# Altium footprint library YQPOWER.PcbLib: 215 footprints (part 6 of 14)
Each footprint in its own frame and in the unit in brackets; x right, y up, seen from the top. Pads: shape width x height; smd on the part's side, far side on the other; paste and mask are expansions set on the pad; w line width, h text height; cw(c..) or ccw(c..) is an arc to the next point about the centre after c.
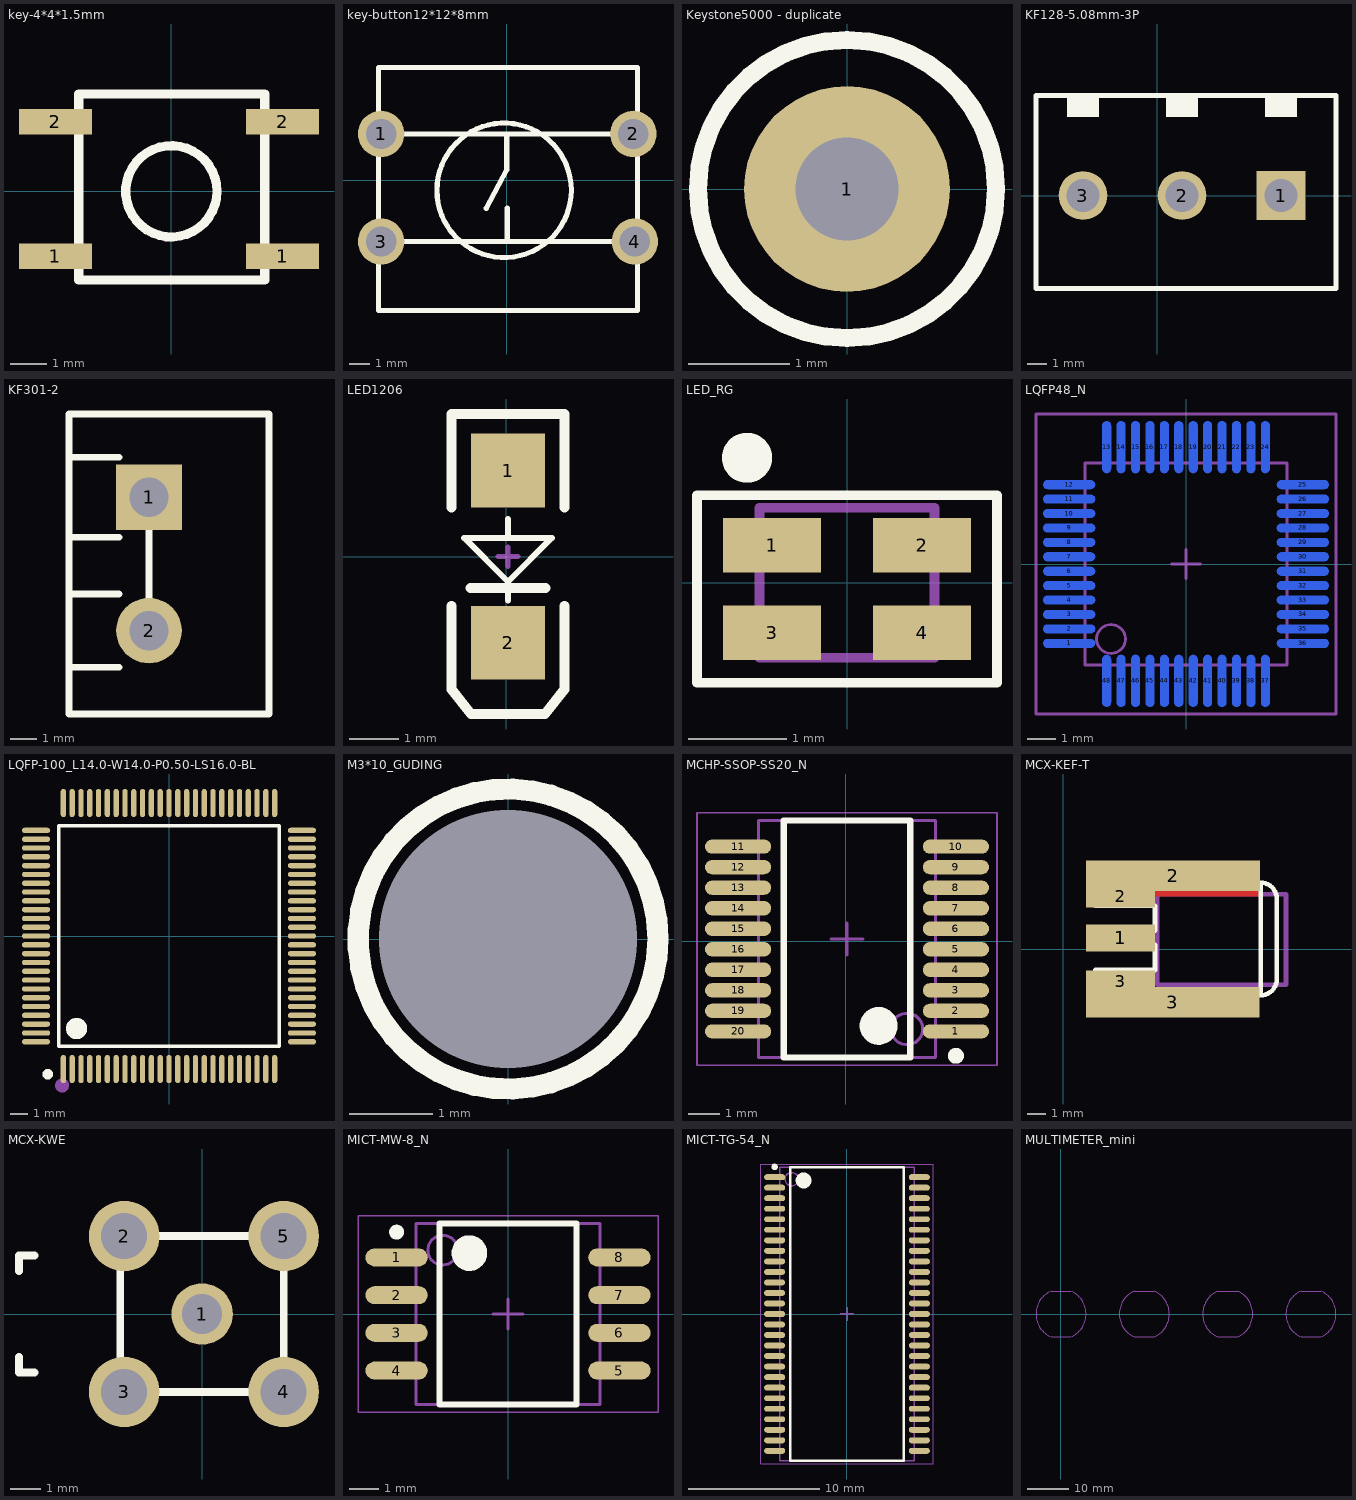
[diagram p5: the footprints below, top view; thin cyan lines are the x and y axes]

## key-4*4*1.5mm [mm]
height 1.5
pads (4):
  rect 2x0.7 smd mask+0.05: 1(-3.175,-1.778) 1(3.048,-1.778) 2(-3.175,1.905) 2(3.048,1.905)
Top Overlay:
  circle w0.254: c0,0 r1.251
  lines w0.254: -2.54,-2.433 2.56,-2.433 2.56,2.667 -2.54,2.667 -2.54,-2.433

## key-button12*12*8mm [mm]
height 10
pads (4):
  round 2.3 hole 1.5: 1(-6.223,2.286) 2(6.277,2.286) 3(-6.223,-3.048) 4(6.35,-3.048)
Top Overlay:
  circle w0.254: c-0.127,-0.508 r3.334
  lines w0.254: -6.223,-3.048 6.277,-3.048 ; -6.223,2.286 6.277,2.286 ; -1.016,-1.397 0,0.508 0,2.159 ; 0.027,-3.048 0.027,-1.397 ; -6.35,-6.477 -6.35,5.588 6.477,5.588 6.477,-6.477 -6.35,-6.477

## Keystone5000 - duplicate [mil] "For Keystone 500x miniature loop terminals"
height 181.1
pads (1):
  round 80 hole 40: 1(0,0)
Top Overlay:
  circle w7: c0,0 r58
Mechanical 5:
  circle w5: c0,0 r58.31
  text ".Designator" at -45,-10 h30
3D body "Keystone_5000.stp": height 181.97, standoff -118.11, extent -49,-49 49.04,49.24

## KF128-5.08mm-3P [mm]
height 8.382
pads (3):
  rect 2.5x2.5 hole 1.7: 1(6.35,0)
  round 2.5 hole 1.7: 2(1.27,0) 3(-3.81,0)
Top Overlay:
  region: -4.64,5.173 -4.64,4.03 -2.989,4.03 -2.989,5.173
  region: 0.44,5.173 0.44,4.03 2.091,4.03 2.091,5.173
  region: 5.52,5.173 5.52,4.03 7.171,4.03 7.171,5.173
  lines w0.254: -6.22,-4.76 -6.22,5.14 9.17,5.14 9.17,-4.76 -6.22,-4.76

## KF301-2 [mm]
pads (2):
  rect 2.5x2.5 hole 1.5: 1(-9.017,10.16)
  round 2.5 hole 1.5: 2(-9.017,5.08)
Top Overlay:
  lines w0.254: -12.065,3.683 -10.16,3.683 ; -12.065,6.477 -10.16,6.477 ; -12.065,8.636 -10.16,8.636 ; -12.065,11.684 -10.16,11.684 ; -9.017,5.16 -9.017,10.16 ; -12.065,1.905 -12.065,13.335 -4.445,13.335 -4.445,1.905 -12.065,1.905

## LED1206 [mm]
pads (2):
  rect 1.5x1.5 smd: 1(0.036,1.75) 2(0.036,-1.75)
Top Overlay:
  lines w0.125: 0.036,-0.889 0.036,-0.508 ; 0.036,0.381 0.036,0.762 ; 0.036,-0.508 0.925,0.381 -0.853,0.381 0.036,-0.508
  lines w0.2: -1.114,-1 -1.114,-2.7 -0.714,-3.2 0.786,-3.2 1.186,-2.7 1.186,-1 ; -1.114,1 -1.114,2.9 1.186,2.9 1.186,1 ; -0.726,-0.635 0.798,-0.635
Mechanical 1:
  lines w0.1: -0.164,0 0.236,0 ; 0.036,-0.2 0.036,0.2

## LED_RG [mm]
pads (4):
  rect 1x0.55 smd: 1(-0.762,0.381) 2(0.762,0.381) 3(-0.762,-0.508) 4(0.762,-0.508)
Top Overlay:
  circle w0.254: c-1.016,1.27 r0.127
  lines w0.1: -1.524,-1.016 -1.524,0.889 1.524,0.889 1.524,-1.016 -1.524,-1.016
Mechanical 3:
  lines w0.1: -0.889,-0.762 -0.889,0.762 0.889,0.762 0.889,-0.762 -0.889,-0.762

## LQFP48_N [mm] "Thin QFP, 48-Leads, Body 7x7mm, Pitch 0.5mm, IPC Medium Density"
height 1.6
pads (48):
  oval 1.8x0.3 smd far side: 1(-4.05,-2.75) 2(-4.05,-2.25) 3(-4.05,-1.75) 4(-4.05,-1.25) 5(-4.05,-0.75) 6(-4.05,-0.25) 7(-4.05,0.25) 8(-4.05,0.75) 9(-4.05,1.25) 10(-4.05,1.75) 11(-4.05,2.25) 12(-4.05,2.75) 25(4.05,2.75) 26(4.05,2.25) 27(4.05,1.75) 28(4.05,1.25) 29(4.05,0.75) 30(4.05,0.25) 31(4.05,-0.25) 32(4.05,-0.75) 33(4.05,-1.25) 34(4.05,-1.75) 35(4.05,-2.25) 36(4.05,-2.75)
  oval 0.3x1.8 smd far side: 13(-2.75,4.05) 14(-2.25,4.05) 15(-1.75,4.05) 16(-1.25,4.05) 17(-0.75,4.05) 18(-0.25,4.05) 19(0.25,4.05) 20(0.75,4.05) 21(1.25,4.05) 22(1.75,4.05) 23(2.25,4.05) 24(2.75,4.05) 37(2.75,-4.05) 38(2.25,-4.05) 39(1.75,-4.05) 40(1.25,-4.05) 41(0.75,-4.05) 42(0.25,-4.05) 43(-0.25,-4.05) 44(-0.75,-4.05) 45(-1.25,-4.05) 46(-1.75,-4.05) 47(-2.25,-4.05) 48(-2.75,-4.05)
Bottom Overlay:
  circle w0.25: c-4.05,-3.45 r0.125
  circle w0.6: c-1.75,-1.75 r0.3
  lines w0.2: -2.75,-2.75 -2.75,2.75 2.75,2.75 2.75,-2.75 -2.75,-2.75
Mechanical 13:
  circle w0.1: c-2.6,-2.6 r0.5
  lines w0.1: -3.5,-3.5 -3.5,3.5 3.5,3.5 3.5,-3.5 -3.5,-3.5
Mechanical 15:
  lines w0.1: -0.5,0 0.5,0 ; 0,-0.5 0,0.5 ; -5.2,-5.2 -5.2,5.2 5.2,5.2 5.2,-5.2 -5.2,-5.2
3D body: height 1.6, standoff 0, extent -3.5,-3.5 3.5,3.5

## LQFP-100_L14.0-W14.0-P0.50-LS16.0-BL [mm]
pads (100):
  oval 0.3x1.6 smd: 1(-6,-7.55) 2(-5.5,-7.55) 3(-5,-7.55) 4(-4.5,-7.55) 5(-4,-7.55) 6(-3.5,-7.55) 7(-3,-7.55) 8(-2.5,-7.55) 9(-2,-7.55) 10(-1.5,-7.55) 11(-1,-7.55) 12(-0.5,-7.55) 13(0,-7.55) 14(0.5,-7.55) 15(1,-7.55) 16(1.5,-7.55) 17(2,-7.55) 18(2.5,-7.55) 19(3,-7.55) 20(3.5,-7.55) 21(4,-7.55) 22(4.5,-7.55) 23(5,-7.55) 24(5.5,-7.55) 25(6,-7.55) 51(6,7.55) 52(5.5,7.55) 53(5,7.55) 54(4.5,7.55) 55(4,7.55) 56(3.5,7.55) 57(3,7.55) 58(2.5,7.55) 59(2,7.55) 60(1.5,7.55) 61(1,7.55) 62(0.5,7.55) 63(0,7.55) 64(-0.5,7.55) 65(-1,7.55) 66(-1.5,7.55) 67(-2,7.55) 68(-2.5,7.55) 69(-3,7.55) 70(-3.5,7.55) 71(-4,7.55) 72(-4.5,7.55) 73(-5,7.55) 74(-5.5,7.55) 75(-6,7.55)
  oval 1.6x0.3 smd: 26(7.55,-6) 27(7.55,-5.5) 28(7.55,-5) 29(7.55,-4.5) 30(7.55,-4) 31(7.55,-3.5) 32(7.55,-3) 33(7.55,-2.5) 34(7.55,-2) 35(7.55,-1.5) 36(7.55,-1) 37(7.55,-0.5) 38(7.55,0) 39(7.55,0.5) 40(7.55,1) 41(7.55,1.5) 42(7.55,2) 43(7.55,2.5) 44(7.55,3) 45(7.55,3.5) 46(7.55,4) 47(7.55,4.5) 48(7.55,5) 49(7.55,5.5) 50(7.55,6) 76(-7.55,6) 77(-7.55,5.5) 78(-7.55,5) 79(-7.55,4.5) 80(-7.55,4) 81(-7.55,3.5) 82(-7.55,3) 83(-7.55,2.5) 84(-7.55,2) 85(-7.55,1.5) 86(-7.55,1) 87(-7.55,0.5) 88(-7.55,0) 89(-7.55,-0.5) 90(-7.55,-1) 91(-7.55,-1.5) 92(-7.55,-2) 93(-7.55,-2.5) 94(-7.55,-3) 95(-7.55,-3.5) 96(-7.55,-4) 97(-7.55,-4.5) 98(-7.55,-5) 99(-7.55,-5.5) 100(-7.55,-6)
Top Overlay:
  lines w0.2: -6.25,-6.25 -6.25,6.25 6.25,6.25 6.25,-6.25 -6.25,-6.25
  lines w0.3: -6.883,-7.696 ccw(c-6.882,-7.846) -6.881,-7.696
  lines w0.6: -5.25,-4.95 ccw(c-5.248,-5.25) -5.245,-4.95
Mechanical 15:
  circle w0.4: c-6.071,-8.484 r0.2

## M3*10_GUDING [mm]
pads (1):
  round 0 hole 3.1: 1(0,0)
Top Overlay:
  circle w0.254: c0,0 r1.8

## MCHP-SSOP-SS20_N [mm]
pads (20):
  oval 2.1x0.45 smd: 1(3.488,-2.861) 2(3.488,-2.211) 3(3.488,-1.561) 4(3.488,-0.911) 5(3.488,-0.261) 6(3.488,0.389) 7(3.488,1.039) 8(3.488,1.689) 9(3.488,2.339) 10(3.488,2.989) 11(-3.412,2.989) 12(-3.412,2.339) 13(-3.412,1.689) 14(-3.412,1.039) 15(-3.412,0.389) 16(-3.412,-0.261) 17(-3.412,-0.911) 18(-3.412,-1.561) 19(-3.412,-2.211) 20(-3.412,-2.861)
Top Overlay:
  circle w0.6: c1.038,-2.686 r0.3
  circle w0.25: c3.488,-3.636 r0.125
  lines w0.2: -1.962,-3.686 2.038,-3.686 2.038,3.814 -1.962,3.814 -1.962,-3.686
Mechanical 13:
  circle w0.1: c1.938,-2.786 r0.5
  lines w0.1: -2.762,-3.686 2.838,-3.686 2.838,3.814 -2.762,3.814 -2.762,-3.686
Mechanical 15:
  lines w0.05: -4.712,-3.936 4.788,-3.936 4.788,4.064 -4.712,4.064 -4.712,-3.936
  lines w0.1: -0.462,0.064 0.538,0.064 ; 0.038,-0.436 0.038,0.564
3D body: height 2, standoff 0.05, extent -2.762,-3.686 2.838,3.814

## MCX-KEF-T [mm] "贴片柱子"
height 5
pads (5):
  rect 3.8x1.5 smd: 1(3.175,0.635)
  rect 3.8x1.2 smd: 2(3.175,2.921) 3(3.175,-1.778)
  rect 9.6x1.7 smd: 2(6.08,4.06) 3(6.07,-2.92)
Top Layer:
  rectangle: 4.064,2.921 10.922,3.683
Top Overlay:
  lines w0.254: 10.287,-2.54 10.922,-2.54 ; 10.414,3.683 10.922,3.683 ; 10.922,-2.54 ccw(c10.922,-1.651) 11.811,-1.651 11.811,2.794 ccw(c10.922,2.794) 10.922,3.683 ; 10.922,-2.54 1.905,-2.54 1.778,-2.54 1.778,-1.143 5.08,-1.143 5.08,0.254 1.778,0.254 1.778,0.381 1.778,1.016 5.08,1.016 5.08,2.413 1.778,2.413 1.778,2.667 1.778,3.683 10.922,3.683 ; 10.922,-2.54 10.922,3.683
Mechanical 1:
  lines w0.254: 5.207,-1.952 5.207,3.048 12.319,3.048 12.319,-1.952 5.207,-1.952

## MCX-KWE [mm] "6MM"
pads (5):
  round 2 hole 1.3: 1(0,0)
  round 2.3 hole 1.5: 2(-2.54,2.54) 3(-2.54,-2.54) 4(2.66,-2.54) 5(2.66,2.54)
Top Overlay:
  lines w0.254: -5.969,-1.397 -5.969,-1.905 -5.461,-1.905 ; -5.969,1.397 -5.969,1.905 -5.461,1.905 ; -2.667,-2.54 -2.667,2.54 2.66,2.54 2.66,-2.54 -2.667,-2.54

## MICT-MW-8_N [mm] "SOIC, 8-Leads, Body 6.2x6.1mm, Pitch 1.27mm, IPC Medium Density"
pads (8):
  oval 2.1x0.6 smd: 1(-3.75,1.905) 2(-3.75,0.635) 3(-3.75,-0.635) 4(-3.75,-1.905) 5(3.75,-1.905) 6(3.75,-0.635) 7(3.75,0.635) 8(3.75,1.905)
Top Overlay:
  circle w0.25: c-3.75,2.755 r0.125
  circle w0.6: c-1.3,2.05 r0.3
  lines w0.2: -2.3,-3.05 -2.3,3.05 2.3,3.05 2.3,-3.05 -2.3,-3.05
Mechanical 13:
  circle w0.1: c-2.2,2.15 r0.5
  lines w0.1: -3.1,-3.05 -3.1,3.05 3.1,3.05 3.1,-3.05 -3.1,-3.05
Mechanical 15:
  lines w0.05: -5.05,-3.3 -5.05,3.3 5.05,3.3 5.05,-3.3 -5.05,-3.3
  lines w0.1: -0.5,0 0.5,0 ; 0,-0.5 0,0.5
3D body: height 0, standoff 0, extent -3.1,-3.05 3.1,3.05

## MICT-TG-54_N [mm] "SOP, 54-Leads, Body 22.22x10.16mm, Pitch 0.8mm, IPC Medium Density"
height 1.2
pads (54):
  oval 1.6x0.45 smd: 1(-5.5,10.4) 2(-5.5,9.6) 3(-5.5,8.8) 4(-5.5,8) 5(-5.5,7.2) 6(-5.5,6.4) 7(-5.5,5.6) 8(-5.5,4.8) 9(-5.5,4) 10(-5.5,3.2) 11(-5.5,2.4) 12(-5.5,1.6) 13(-5.5,0.8) 14(-5.5,0) 15(-5.5,-0.8) 16(-5.5,-1.6) 17(-5.5,-2.4) 18(-5.5,-3.2) 19(-5.5,-4) 20(-5.5,-4.8) 21(-5.5,-5.6) 22(-5.5,-6.4) 23(-5.5,-7.2) 24(-5.5,-8) 25(-5.5,-8.8) 26(-5.5,-9.6) 27(-5.5,-10.4) 28(5.5,-10.4) 29(5.5,-9.6) 30(5.5,-8.8) 31(5.5,-8) 32(5.5,-7.2) 33(5.5,-6.4) 34(5.5,-5.6) 35(5.5,-4.8) 36(5.5,-4) 37(5.5,-3.2) 38(5.5,-2.4) 39(5.5,-1.6) 40(5.5,-0.8) 41(5.5,0) 42(5.5,0.8) 43(5.5,1.6) 44(5.5,2.4) 45(5.5,3.2) 46(5.5,4) 47(5.5,4.8) 48(5.5,5.6) 49(5.5,6.4) 50(5.5,7.2) 51(5.5,8) 52(5.5,8.8) 53(5.5,9.6) 54(5.5,10.4)
Top Overlay:
  circle w0.6: c-3.3,10.15 r0.3
  circle w0.25: c-5.5,11.175 r0.125
  lines w0.2: -4.3,-11.15 4.3,-11.15 4.3,11.15 -4.3,11.15 -4.3,-11.15
Mechanical 13:
  circle w0.1: c-4.2,10.25 r0.5
  lines w0.1: -5.1,-11.15 5.1,-11.15 5.1,11.15 -5.1,11.15 -5.1,-11.15
Mechanical 15:
  lines w0.05: -6.55,-11.4 6.55,-11.4 6.55,11.4 -6.55,11.4 -6.55,-11.4
  lines w0.1: -0.5,0 0.5,0 ; 0,-0.5 0,0.5
3D body: height 1.2, standoff 0.05, extent -5.1,-11.15 5.1,11.15

## MULTIMETER_mini [mm]
Mechanical 1:
  lines w0.1: -2.42,-5.6 2.44,-5.6 ; -2.418,-5.596 cw(c0.009,0) -2.409,5.6 ; -2.4,5.6 2.42,5.6 ; 2.421,5.603 cw(c0.009,0) 2.428,-5.6 ; 17.9,-5.6 22.76,-5.6 ; 17.902,-5.596 cw(c20.329,0) 17.911,5.6 ; 17.92,5.6 22.74,5.6 ; 22.741,5.603 cw(c20.329,0) 22.748,-5.6 ; 38.22,-5.6 43.08,-5.6 ; 38.222,-5.596 cw(c40.649,0) 38.231,5.6 ; 38.24,5.6 43.06,5.6 ; 43.061,5.603 cw(c40.649,0) 43.068,-5.6 ; 58.54,-5.6 63.4,-5.6 ; 58.542,-5.596 cw(c60.969,0) 58.551,5.6 ; 58.56,5.6 63.38,5.6 ; 63.381,5.603 cw(c60.969,0) 63.388,-5.6